# Altium footprint library Mechanical_Old.PcbLib: 125 footprints (part 7 of 8)
Each footprint in its own frame and in the unit in brackets; x right, y up, seen from the top. Pads: shape width x height; smd on the part's side, far side on the other; paste and mask are expansions set on the pad; w line width, h text height; cw(c..) or ccw(c..) is an arc to the next point about the centre after c.
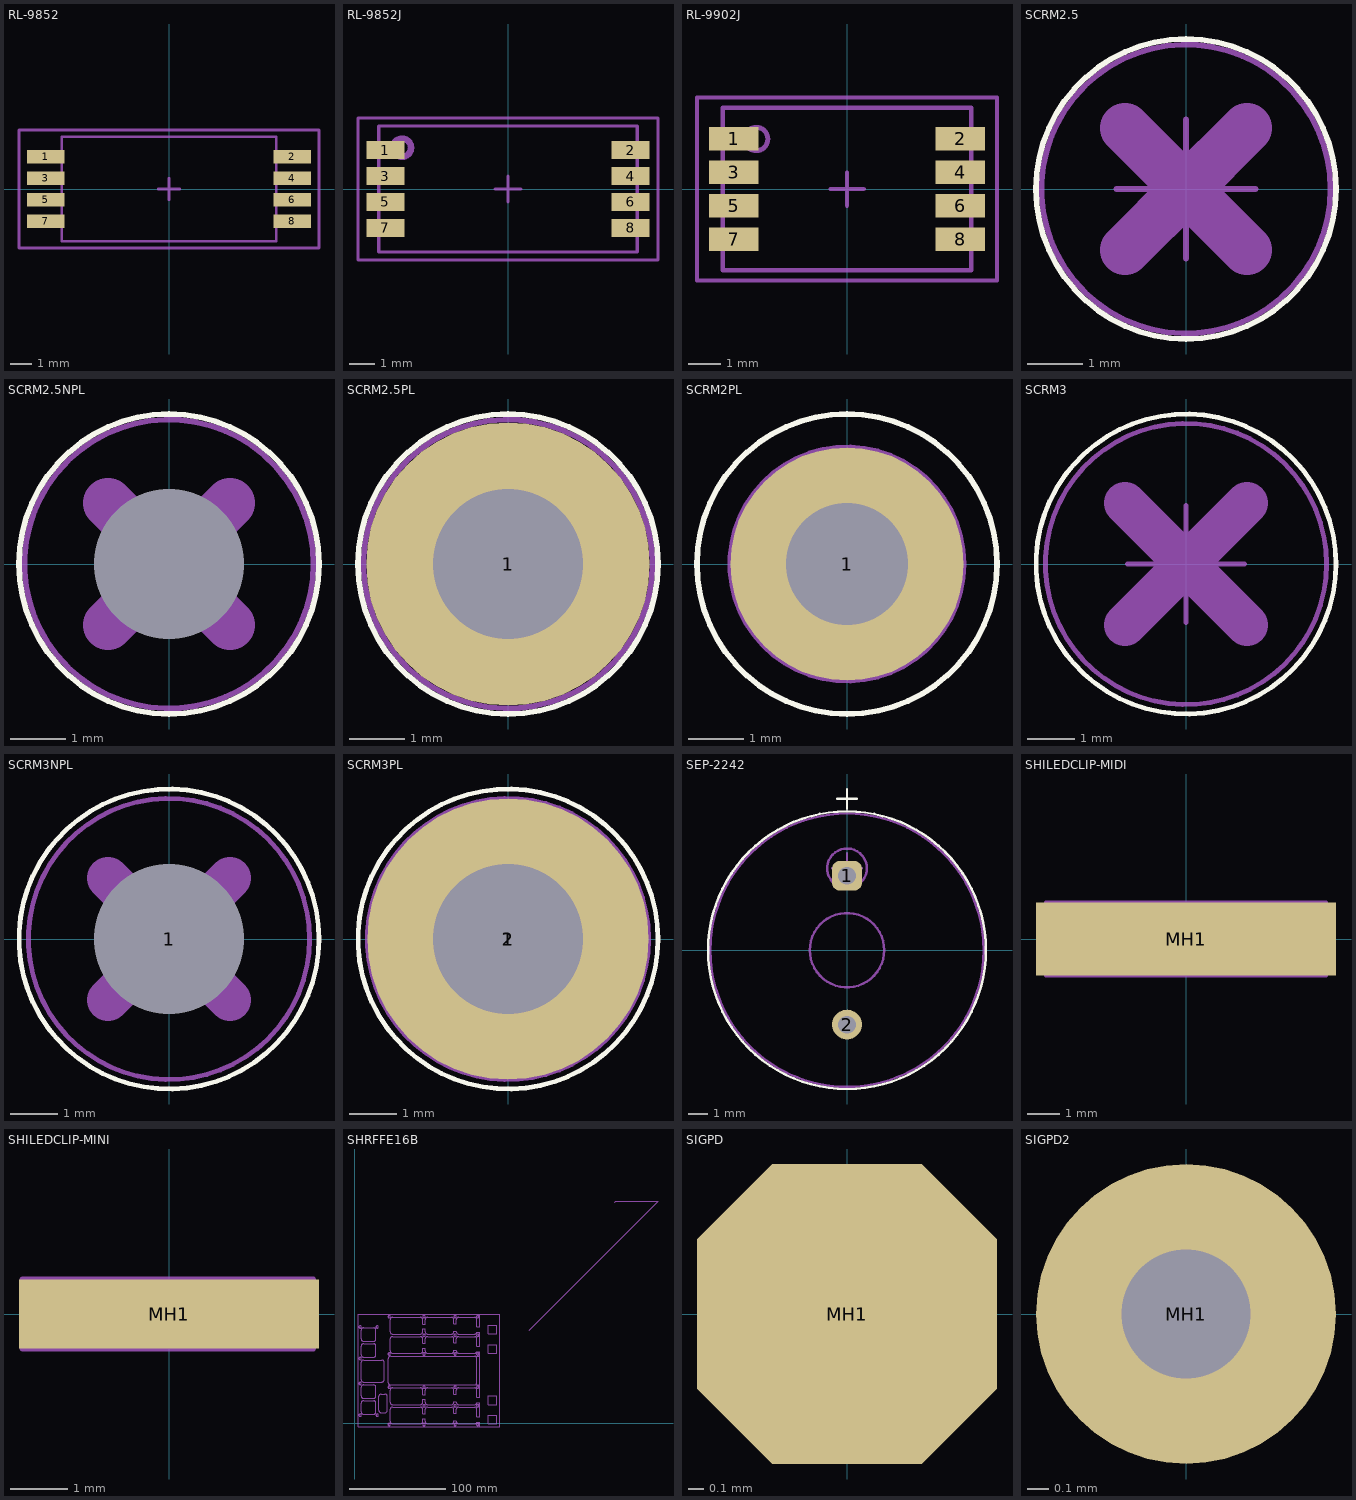
[diagram p6: the footprints below, top view; thin cyan lines are the x and y axes]

## RL-9852 [mil] "Reed Relay 9852 series"
height 210
pads (8):
  rect 70x25 smd: 1(-230,60.24) 2(230,60.24) 3(-230,20.08) 4(230,20.08) 5(-230,-20.08) 6(230,-20.08) 7(-230,-60.24) 8(230,-60.24)
Mechanical 13:
  lines w5: -200,-97.5 -200,97.5 200,97.5 200,-97.5 -200,-97.5
Mechanical 15:
  lines w5: -20,0 20,0 ; 0,-20 0,20 ; -280,-110 -280,110 280,110 280,-110 -280,-110
3D body: height 210, standoff 0, extent -200,-97.44 200,97.44
3D body: height 210.39, standoff 210, extent -179.21,40.35 -140,79.65

## RL-9852J [mm]
pads (8):
  rect 1.5x0.71 smd: 1(-4.825,1.53) 2(4.825,1.53) 3(-4.825,0.51) 4(4.825,0.51) 5(-4.825,-0.51) 6(4.825,-0.51) 7(-4.825,-1.53) 8(4.825,-1.53)
Mechanical 13:
  circle w0.254: c-4.172,1.624 r0.359
  lines w0.127: -5.08,-2.475 -5.08,2.475 5.08,2.475 5.08,-2.475 -5.08,-2.475
Mechanical 15:
  lines w0.127: -0.508,0 0.508,0 ; 0,-0.508 0,0.508 ; -5.9,-2.794 5.9,-2.794 5.9,2.794 -5.9,2.794 -5.9,-2.794
3D body: height 3, standoff 0, extent -5.08,-2.475 5.08,2.475
3D body: height 3.61, standoff 3.6, extent -4.702,1.116 -3.706,2.114
3D body: height 3.6, standoff 3, extent -5.08,-2.475 5.08,2.475

## RL-9902J [mm]
pads (8):
  rect 1.5x0.71 smd: 1(-3.45,1.53) 2(3.45,1.53) 3(-3.45,0.51) 4(3.45,0.51) 5(-3.45,-0.51) 6(3.45,-0.51) 7(-3.45,-1.53) 8(3.45,-1.53)
Mechanical 13:
  circle w0.15: c-2.772,1.524 r0.359
  lines w0.127: -3.785,-2.475 -3.785,2.475 3.785,2.475 3.785,-2.475 -3.785,-2.475
Mechanical 15:
  lines w0.127: -0.508,0 0.508,0 ; 0,-0.508 0,0.508 ; -4.572,-2.794 4.572,-2.794 4.572,2.794 -4.572,2.794 -4.572,-2.794
3D body: height 3.61, standoff 3.6, extent -3.302,1.016 -2.306,2.014
3D body: height 3.6, standoff 0, extent -3.785,-2.475 3.785,2.475

## SCRM2.5 [mm] "M2.5mm DIN7985A no hole (head only)"
height 2
Top Overlay:
  circle w0.102: c0,0 r2.7
Mechanical 13:
  circle w0.102: c0,0 r2.6
  lines w0.9: -1.1,-1.1 0,0 1.1,1.1 ; -1.1,1.1 1.1,-1.1
Mechanical 15:
  lines w0.102: -1.25,0 1.25,0 ; 0,-1.25 0,1.25
3D body: height 0.8, standoff 0, extent -2.591,-2.591 2.6,2.616
3D body: height 2, standoff 0.8, extent -2.591,-2.591 2.6,2.616
3D body: height 0.81, standoff 0.8, extent -2.211,-2.311 2.311,2.311

## SCRM2.5NPL [mm] "M2.5mm DIN7985A non plated hole (head only) D2.7mm"
height 2
pads (1):
  round 0 hole 2.7 unplated paste-2 mask+2.6: 1(0,0)
Top Overlay:
  circle w0.102: c0,0 r2.7
Mechanical 13:
  circle w0.102: c0,0 r2.6
  lines w0.9: -1.1,-1.1 0,0 1.1,1.1 ; -1.1,1.1 1.1,-1.1
Mechanical 15:
  lines w0.102: -1.25,0 1.25,0 ; 0,-1.25 0,1.25
3D body: height 0.81, standoff 0.8, extent -2.211,-2.311 2.311,2.311
3D body: height 2, standoff 0.8, extent -2.591,-2.591 2.6,2.616
3D body: height 0.8, standoff 0, extent -2.591,-2.591 2.6,2.616

## SCRM2.5PL [mm] "M2.5mm DIN7985A plated hole D2.7mm"
height 2
pads (1):
  round 5.1 hole 2.7 paste-2 mask+0.2: 1(0,0)
Top Overlay:
  circle w0.102: c0,0 r2.7
Mechanical 13:
  circle w0.102: c0,0 r2.6
  lines w0.9: -1.1,-1.1 0,0 1.1,1.1 ; -1.1,1.1 1.1,-1.1
Mechanical 15:
  lines w0.102: -1.25,0 1.25,0 ; 0,-1.25 0,1.25
3D body: height 0.81, standoff 0.8, extent -2.211,-2.311 2.311,2.311
3D body: height 2, standoff 0.8, extent -2.591,-2.591 2.6,2.616
3D body: height 0.8, standoff 0, extent -2.591,-2.591 2.6,2.616

## SCRM2PL [mm] "M2mm plated hole D22mm"
height 2
pads (1):
  round 4.2 / inner round 3.1 / far side round 3.1 hole 2.2 paste-2 mask+0.2: 1(0,0)
Top Overlay:
  circle w0.102: c0,0 r2.7
Mechanical 13:
  circle w0.102: c0,0 r2.1
  lines w0.9: -1.1,-1.1 0,0 1.1,1.1 ; -1.1,1.1 1.1,-1.1
Mechanical 15:
  lines w0.102: -1.25,0 1.25,0 ; 0,-1.25 0,1.25

## SCRM3 [mm] "M3mm DIN7985A no hole (head only)"
height 2.4
Top Overlay:
  circle w0.102: c0,0 r3.2
Mechanical 13:
  circle w0.102: c0,0 r3
  lines w0.9: -1.3,-1.3 0,0 1.3,1.3 ; -1.3,1.3 1.3,-1.3
Mechanical 15:
  lines w0.102: -1.25,0 1.25,0 ; 0,-1.25 0,1.25
3D body: height 2.4, standoff 0, extent -3.009,-3.009 3.009,3.009
3D body: height 1, standoff 0, extent -1.9,-1.9 1.9,1.9

## SCRM3NPL [mm] "M3mm DIN7985A non plated hole D3.2mm"
height 2.4
pads (2):
  round 6.2 on Top Solder: 1(0,0)
  round 0 hole 3.2 unplated: 1(0,0)
Top Overlay:
  circle w0.102: c0,0 r3.2
Mechanical 13:
  circle w0.102: c0,0 r3
  lines w0.9: -1.3,-1.3 0,0 1.3,1.3 ; -1.3,1.3 1.3,-1.3
Mechanical 15:
  lines w0.102: -1.25,0 1.25,0 ; 0,-1.25 0,1.25
3D body: height 1, standoff 0, extent -1.9,-1.9 1.9,1.9
3D body: height 2.4, standoff 0, extent -3.009,-3.009 3.009,3.009

## SCRM3PL [mm] "M3mm DIN7985A plated hole D3.2mm"
height 2.4
pads (3):
  round 6.2 on Top Solder: 1(0,0)
  round 6 hole 3.2 mask-5: 1(0,0)
  round 4 on Bottom Solder: 2(0,0)
Top Overlay:
  circle w0.102: c0,0 r3.2
Mechanical 13:
  circle w0.102: c0,0 r3
  lines w0.9: -1.3,-1.3 0,0 1.3,1.3 ; -1.3,1.3 1.3,-1.3
Mechanical 15:
  lines w0.102: -1.25,0 1.25,0 ; 0,-1.25 0,1.25
3D body: height 1, standoff 0, extent -1.9,-1.9 1.9,1.9
3D body: height 2.4, standoff 0, extent -3.009,-3.009 3.009,3.009

## SEP-2242 [mil] "Buzzer D14x8mm"
height 295.28
pads (2):
  rrect50% 60x60 hole 35.43 paste-90: 1(0,150)
  round 60 hole 35.43: 2(0,-150)
Top Overlay:
  circle w5: c0,0 r280
  lines w5: -20,305 20,305 ; 0,285 0,325
Mechanical 13:
  circle w5: c0,0 r275.59
  circle w5: c0,0 r75
  circle w5: c0,165 r40
  lines w5: -30,165 30,165 ; 0,135 0,195

## SHILEDCLIP-MIDI [mm] "RFI Shield Clip 0.3 Shield Thickness"
height 3.5
pads (1):
  rect 9.4x2.3 smd: MH1(0,0)
Mechanical 13:
  lines w0.102: -1.778,-1.15 -1.778,1.15 ; 1.778,-1.15 1.778,1.15 ; -4.4,-1.15 -4.4,1.15 4.4,1.15 4.4,-1.15 -4.4,-1.15
3D body: height 3.5, standoff 0, extent -4.4,-1.15 4.4,1.15

## SHILEDCLIP-MINI [mm] "RFI Shield Clip 0.3 Shield Thickness"
height 3.5
pads (1):
  rect 5.2x1.2 smd: MH1(0,0)
Mechanical 13:
  lines w0.102: -0.778,-0.6 -0.778,0.6 ; 0.778,-0.6 0.778,0.6 ; -2.54,-0.6 2.5,-0.6 2.5,0.6 -2.54,0.6 -2.54,-0.6
3D body: height 2.23, standoff 0, extent -2.54,-0.535 2.54,0.535

## SHRFFE16B [mm] "Shield for RFFE16 version B & B1"
Mechanical 2:
  circle w0.102: c35.75,72.36 r1.25
  circle w0.102: c104.5,91.86 r1.25
  circle w0.102: c104.5,111.36 r1.25
  circle w0.102: c104.5,72.36 r1.25
  circle w0.102: c128,72.36 r1.25
  circle w0.102: c128,91.86 r1.25
  circle w0.102: c128,111.36 r1.25
  circle w0.102: c72,91.86 r1.25
  circle w0.102: c72,72.36 r1.25
  circle w0.102: c35.75,111.36 r1.25
  circle w0.102: c5.5,100.61 r1.25
  circle w0.102: c23.25,100.61 r1.25
  circle w0.102: c5.5,67.61 r1.25
  circle w0.102: c5.5,41.61 r1.25
  circle w0.102: c23.25,8.61 r1.25
  circle w0.102: c5.5,8.61 r1.25
  circle w0.102: c72,111.36 r1.25
  circle w0.102: c72,37.86 r1.25
  circle w0.102: c35.75,37.86 r1.25
  circle w0.102: c72,-1.14 r1.25
  circle w0.102: c72,18.36 r1.25
  circle w0.102: c128,37.86 r1.25
  circle w0.102: c128,18.36 r1.25
  circle w0.102: c128,-1.14 r1.25
  circle w0.102: c104.5,-1.14 r1.25
  circle w0.102: c104.5,37.86 r1.25
  circle w0.102: c104.5,18.36 r1.25
  circle w0.102: c35.75,-1.14 r1.25
  lines w0.102: 3.25,-3.39 3.25,113.61 130.25,113.61 151.25,113.61 151.25,-3.39 3.25,-3.39 ; 25,13.61 ccw(c27.5,13.61) 27.5,11.11 31.25,11.11 ccw(c31.25,13.61) 33.75,13.61 33.75,28.11 ccw(c31.25,28.11) 31.25,30.61 27.5,30.61 ccw(c27.5,28.11) 25,28.11 25,13.61 ; 139.05,-0.49 139.05,8.51 148.05,8.51 148.05,-0.49 139.05,-0.49 ; 139.05,19.71 139.05,28.71 148.05,28.71 148.05,19.71 139.05,19.71 ; 139.05,73.11 139.05,82.11 148.05,82.11 148.05,73.11 139.05,73.11 ; 139.05,93.31 148.05,93.31 148.05,102.31 139.05,102.31 139.05,93.31
Mechanical 3:
  drawing of 193 lines, arcs and shapes, not listed
Mechanical 13:
  lines w0.1: 181.75,97.325 315.975,231.55 272,231.55 271.05,230.6
3D body: height 0, standoff 0, extent 3.25,-3.39 151.25,113.61

## SIGPD [mm] "Signal Pad"
pads (1):
  oct 2x2 smd: MH1(0,0)

## SIGPD2 [mm] "Signal Pad"
pads (1):
  round 1.4 hole 0.6: MH1(0,0)